# Altium footprint library PHOENIX THD.PcbLib: 109 footprints (part 5 of 8) (continued)
## PHOENIX_1777086 [mm] "PCB Header, 12A, 320V, Pitch: 5.08mm, 3 Positions, MSTBV Serie"
height 12
pads (5):
  round 2.1 hole 1.4: 1(-5.08,0) 2(0,0) 3(5.08,0)
  round 3.8 hole 2.4: P1(-10.16,0) P2(10.16,0)
Top Overlay:
  lines w0.2: -12.7,4.23 -6.055,4.23 ; -7.62,-2.2 -7.12,-2.2 ; -7.62,3.093 7.62,3.093 ; -5.724,3.093 -6.055,3.405 ; -4.436,3.093 -4.105,3.405 ; -0.644,3.093 -0.975,3.405 ; 0.644,3.093 0.975,3.405 ; 4.436,3.093 4.105,3.405 ; 5.724,3.093 6.055,3.405 ; 7.62,-2.2 7.12,-2.2 ; 12.7,4.23 6.055,4.23 ; -7.234,-2.5 ccw(c-5.08,0) -2.926,-2.5 ; -7.234,-2.5 -7.62,-2.5 -7.62,3.405 -6.055,3.405 ; -7.234,-2.5 -7.12,-2.2 ; -7.12,-2.2 ccw(c-5.08,0) -3.04,-2.2 ; -6.055,3.405 -6.055,4.23 ; -6.055,4.23 -5.685,4.703 -4.475,4.703 -4.105,4.23 ; -4.105,3.405 -0.975,3.405 ; -4.105,3.405 -4.105,4.23 ; -4.105,4.23 -0.975,4.23 ; -3.04,-2.2 -2.926,-2.5 ; -3.04,-2.2 -2.04,-2.2 ; -2.926,-2.5 -2.154,-2.5 ; -2.154,-2.5 ccw(c0,0) 2.154,-2.5 ; -2.154,-2.5 -2.04,-2.2 ; -2.04,-2.2 ccw(c0,0) 2.04,-2.2 ; -0.975,3.405 -0.975,4.23 ; -0.975,4.23 -0.605,4.703 0.605,4.703 0.975,4.23 ; 0.975,3.405 4.105,3.405 ; 0.975,3.405 0.975,4.23 ; 0.975,4.23 4.105,4.23 ; 2.04,-2.2 2.154,-2.5 ; 2.04,-2.2 3.04,-2.2 ; 2.154,-2.5 2.926,-2.5 ; 2.926,-2.5 ccw(c5.08,0) 7.234,-2.5 ; 2.926,-2.5 3.04,-2.2 ; 3.04,-2.2 ccw(c5.08,0) 7.12,-2.2 ; 4.105,3.405 4.105,4.23 ; 4.105,4.23 4.475,4.703 5.685,4.703 6.055,4.23 ; 6.055,3.405 7.62,3.405 7.62,-2.5 7.234,-2.5 ; 6.055,3.405 6.055,4.23 ; 7.12,-2.2 7.234,-2.5 ; -12.7,-3.87 -12.7,4.73 12.7,4.73 12.7,-3.87 -12.7,-3.87 ; -2.741,-0.75 -2.54,0 -2.339,-0.75 -2.741,-0.75 ; 2.339,-0.75 2.54,0 2.741,-0.75 2.339,-0.75
  text "1" at -5.22,3.505 h0.75
  text "2" at -0.22,3.505 h0.75
  text "3" at 4.851,3.505 h0.75
Mechanical 8:
  lines w0.1: -10.66,0 -10.16,0 ; -10.16,-0.5 -10.16,0 ; -10.16,0.5 -10.16,0 ; -9.66,0 -10.16,0 ; -5.58,0 -5.08,0 ; -5.08,-0.5 -5.08,0 ; -5.08,0.5 -5.08,0 ; -4.58,0 -5.08,0 ; -0.5,0 0,0 ; 0,-0.5 0,0 ; 0,0.5 0,0 ; 0.5,0 0,0 ; 4.58,0 5.08,0 ; 5.08,-0.5 5.08,0 ; 5.08,0.5 5.08,0 ; 5.58,0 5.08,0 ; 9.66,0 10.16,0 ; 10.16,-0.5 10.16,0 ; 10.16,0.5 10.16,0 ; 10.66,0 10.16,0
Mechanical 14:
  circle w0.1: c10.16,0 r1.25
  circle w0.1: c-10.16,0 r1.25
  circle w0.1: c0,0 r1.4
  circle w0.1: c5.08,0 r1.4
  lines w0.1: -12.7,4.23 -6.055,4.23 ; -7.62,-2.2 -7.12,-2.2 ; -7.62,3.093 7.62,3.093 ; -5.724,3.093 -6.055,3.405 ; -4.436,3.093 -4.105,3.405 ; -0.644,3.093 -0.975,3.405 ; 0.644,3.093 0.975,3.405 ; 4.436,3.093 4.105,3.405 ; 5.724,3.093 6.055,3.405 ; 7.62,-2.2 7.12,-2.2 ; 12.7,4.23 6.055,4.23 ; -7.234,-2.5 ccw(c-5.08,0) -2.926,-2.5 ; -7.234,-2.5 -7.62,-2.5 -7.62,3.405 -6.055,3.405 ; -7.234,-2.5 -7.12,-2.2 ; -7.12,-2.2 ccw(c-5.08,0) -3.04,-2.2 ; -6.055,3.405 -6.055,4.23 ; -6.055,4.23 -5.685,4.703 -4.475,4.703 -4.105,4.23 ; -5.58,-0.5 -5.312,-0.232 ; -5.58,-0.5 -5.58,0.5 ; -5.58,-0.5 -4.58,-0.5 ; -5.58,0.5 -5.312,0.232 ; -5.58,0.5 -4.58,0.5 ; -5.312,-0.232 -5.312,0.232 ; -5.312,-0.232 -4.848,-0.232 ; -5.312,0.232 -4.848,0.232 ; -4.848,-0.232 -4.58,-0.5 ; -4.848,-0.232 -4.848,0.232 ; -4.848,0.232 -4.58,0.5 ; -4.58,-0.5 -4.58,0.5 ; -4.105,3.405 -0.975,3.405 ; -4.105,3.405 -4.105,4.23 ; -4.105,4.23 -0.975,4.23 ; -3.04,-2.2 -2.926,-2.5 ; -3.04,-2.2 -2.04,-2.2 ; -2.926,-2.5 -2.154,-2.5 ; -2.154,-2.5 ccw(c0,0) 2.154,-2.5 ; -2.154,-2.5 -2.04,-2.2 ; -2.04,-2.2 ccw(c0,0) 2.04,-2.2 ; -0.975,3.405 -0.975,4.23 ; -0.975,4.23 -0.605,4.703 0.605,4.703 0.975,4.23 ; -0.5,-0.5 -0.232,-0.232 ; -0.5,-0.5 0.5,-0.5 ; -0.5,-0.5 -0.5,0.5 ; -0.5,0.5 -0.232,0.232 ; -0.5,0.5 0.5,0.5 ; -0.232,-0.232 -0.232,0.232 ; -0.232,-0.232 0.232,-0.232 ; -0.232,0.232 0.232,0.232 ; 0.232,-0.232 0.5,-0.5 ; 0.232,-0.232 0.232,0.232 ; 0.232,0.232 0.5,0.5 ; 0.5,-0.5 0.5,0.5 ; 0.975,3.405 4.105,3.405 ; 0.975,3.405 0.975,4.23 ; 0.975,4.23 4.105,4.23 ; 2.04,-2.2 2.154,-2.5 ; 2.04,-2.2 3.04,-2.2 ; 2.154,-2.5 2.926,-2.5 ; 2.926,-2.5 ccw(c5.08,0) 7.234,-2.5 ; 2.926,-2.5 3.04,-2.2 ; 3.04,-2.2 ccw(c5.08,0) 7.12,-2.2 ; 4.105,3.405 4.105,4.23 ; 4.105,4.23 4.475,4.703 5.685,4.703 6.055,4.23 ; 4.58,-0.5 4.848,-0.232 ; 4.58,-0.5 5.58,-0.5 ; 4.58,-0.5 4.58,0.5 ; 4.58,0.5 4.848,0.232 ; 4.58,0.5 5.58,0.5 ; 4.848,-0.232 4.848,0.232 ; 4.848,-0.232 5.312,-0.232 ; 4.848,0.232 5.312,0.232 ; 5.312,-0.232 5.58,-0.5 ; 5.312,-0.232 5.312,0.232 ; 5.312,0.232 5.58,0.5 ; 5.58,-0.5 5.58,0.5 ; 6.055,3.405 7.62,3.405 7.62,-2.5 7.234,-2.5 ; 6.055,3.405 6.055,4.23 ; 7.12,-2.2 7.234,-2.5 ; -12.7,-3.87 -12.7,4.73 12.7,4.73 12.7,-3.87 -12.7,-3.87 ; -5.78,-1.212 ccw(c-5.08,0) -5.78,1.212 -5.78,-1.212 ; -2.741,-0.75 -2.54,0 -2.339,-0.75 -2.741,-0.75 ; 2.339,-0.75 2.54,0 2.741,-0.75 2.339,-0.75
  text "3" at 4.851,3.505 h0.75
  text "2" at -0.22,3.505 h0.75
  text "1" at -5.22,3.505 h0.75
3D body "PHOENIX_1777086.stp": height 12, standoff -3.9, extent -12.7,-3.8 12.7,4.8

## PHOENIX_1777099 [mm] "PCB Header, 12A, 320V, Pitch: 5.08mm, 4 Positions, MSTBV Serie"
height 12
pads (6):
  round 2.1 hole 1.4: 1(-7.62,0) 2(-2.54,0) 3(2.54,0) 4(7.62,0)
  round 3.8 hole 2.4: P1(-12.7,0) P2(12.7,0)
Top Overlay:
  lines w0.2: -15.24,4.23 -8.595,4.23 ; -10.16,-2.2 -9.66,-2.2 ; -10.16,3.093 10.16,3.093 ; -8.264,3.093 -8.595,3.405 ; -6.976,3.093 -6.645,3.405 ; -3.184,3.093 -3.515,3.405 ; -1.896,3.093 -1.565,3.405 ; 1.896,3.093 1.565,3.405 ; 3.184,3.093 3.515,3.405 ; 6.976,3.093 6.645,3.405 ; 8.264,3.093 8.595,3.405 ; 10.16,-2.2 9.66,-2.2 ; 15.24,4.23 8.595,4.23 ; -9.774,-2.5 ccw(c-7.62,0) -5.466,-2.5 ; -9.774,-2.5 -10.16,-2.5 -10.16,3.405 -8.595,3.405 ; -9.774,-2.5 -9.66,-2.2 ; -9.66,-2.2 ccw(c-7.62,0) -5.58,-2.2 ; -8.595,3.405 -8.595,4.23 ; -8.595,4.23 -8.225,4.703 -7.015,4.703 -6.645,4.23 ; -6.645,3.405 -3.515,3.405 ; -6.645,3.405 -6.645,4.23 ; -6.645,4.23 -3.515,4.23 ; -5.58,-2.2 -5.466,-2.5 ; -5.58,-2.2 -4.58,-2.2 ; -5.466,-2.5 -4.694,-2.5 ; -4.694,-2.5 ccw(c-2.54,0) -0.386,-2.5 ; -4.694,-2.5 -4.58,-2.2 ; -4.58,-2.2 ccw(c-2.54,0) -0.5,-2.2 ; -3.515,3.405 -3.515,4.23 ; -3.515,4.23 -3.145,4.703 -1.935,4.703 -1.565,4.23 ; -1.565,3.405 1.565,3.405 ; -1.565,3.405 -1.565,4.23 ; -1.565,4.23 1.565,4.23 ; -0.5,-2.2 -0.386,-2.5 ; -0.5,-2.2 0.5,-2.2 ; -0.386,-2.5 0.386,-2.5 ; 0.386,-2.5 ccw(c2.54,0) 4.694,-2.5 ; 0.386,-2.5 0.5,-2.2 ; 0.5,-2.2 ccw(c2.54,0) 4.58,-2.2 ; 1.565,3.405 1.565,4.23 ; 1.565,4.23 1.935,4.703 3.145,4.703 3.515,4.23 ; 3.515,3.405 6.645,3.405 ; 3.515,3.405 3.515,4.23 ; 3.515,4.23 6.645,4.23 ; 4.58,-2.2 4.694,-2.5 ; 4.58,-2.2 5.58,-2.2 ; 4.694,-2.5 5.466,-2.5 ; 5.466,-2.5 ccw(c7.62,0) 9.774,-2.5 ; 5.466,-2.5 5.58,-2.2 ; 5.58,-2.2 ccw(c7.62,0) 9.66,-2.2 ; 6.645,3.405 6.645,4.23 ; 6.645,4.23 7.015,4.703 8.225,4.703 8.595,4.23 ; 8.595,3.405 10.16,3.405 10.16,-2.5 9.774,-2.5 ; 8.595,3.405 8.595,4.23 ; 9.66,-2.2 9.774,-2.5 ; -15.24,-3.87 -15.24,4.73 15.24,4.73 15.24,-3.87 -15.24,-3.87 ; -5.281,-0.75 -5.08,0 -4.879,-0.75 -5.281,-0.75 ; -0.201,-0.75 0,0 0.201,-0.75 -0.201,-0.75 ; 4.879,-0.75 5.08,0 5.281,-0.75 4.879,-0.75
  text "4" at 7.366,3.505 h0.75
  text "3" at 2.311,3.505 h0.75
  text "2" at -2.76,3.505 h0.75
  text "1" at -7.76,3.505 h0.75
Mechanical 8:
  lines w0.1: -13.2,0 -12.7,0 ; -12.7,-0.5 -12.7,0 ; -12.7,0.5 -12.7,0 ; -12.2,0 -12.7,0 ; -8.12,0 -7.62,0 ; -7.62,-0.5 -7.62,0 ; -7.62,0.5 -7.62,0 ; -7.12,0 -7.62,0 ; -3.04,0 -2.54,0 ; -2.54,-0.5 -2.54,0 ; -2.54,0.5 -2.54,0 ; -2.04,0 -2.54,0 ; -0.5,0 0,0 ; 0,-0.5 0,0 ; 0,0.5 0,0 ; 0.5,0 0,0 ; 2.04,0 2.54,0 ; 2.54,-0.5 2.54,0 ; 2.54,0.5 2.54,0 ; 3.04,0 2.54,0 ; 7.12,0 7.62,0 ; 7.62,-0.5 7.62,0 ; 7.62,0.5 7.62,0 ; 8.12,0 7.62,0 ; 12.2,0 12.7,0 ; 12.7,-0.5 12.7,0 ; 12.7,0.5 12.7,0 ; 13.2,0 12.7,0
Mechanical 14:
  circle w0.1: c2.54,0 r1.4
  circle w0.1: c12.7,0 r1.25
  circle w0.1: c-12.7,0 r1.25
  circle w0.1: c-2.54,0 r1.4
  circle w0.1: c7.62,0 r1.4
  lines w0.1: -15.24,4.23 -8.595,4.23 ; -10.16,-2.2 -9.66,-2.2 ; -10.16,3.093 10.16,3.093 ; -8.264,3.093 -8.595,3.405 ; -6.976,3.093 -6.645,3.405 ; -3.184,3.093 -3.515,3.405 ; -1.896,3.093 -1.565,3.405 ; 1.896,3.093 1.565,3.405 ; 3.184,3.093 3.515,3.405 ; 6.976,3.093 6.645,3.405 ; 8.264,3.093 8.595,3.405 ; 10.16,-2.2 9.66,-2.2 ; 15.24,4.23 8.595,4.23 ; -9.774,-2.5 ccw(c-7.62,0) -5.466,-2.5 ; -9.774,-2.5 -10.16,-2.5 -10.16,3.405 -8.595,3.405 ; -9.774,-2.5 -9.66,-2.2 ; -9.66,-2.2 ccw(c-7.62,0) -5.58,-2.2 ; -8.595,3.405 -8.595,4.23 ; -8.595,4.23 -8.225,4.703 -7.015,4.703 -6.645,4.23 ; -8.12,-0.5 -7.852,-0.232 ; -8.12,-0.5 -8.12,0.5 ; -8.12,-0.5 -7.12,-0.5 ; -8.12,0.5 -7.852,0.232 ; -8.12,0.5 -7.12,0.5 ; -7.852,-0.232 -7.852,0.232 ; -7.852,-0.232 -7.388,-0.232 ; -7.852,0.232 -7.388,0.232 ; -7.388,-0.232 -7.12,-0.5 ; -7.388,-0.232 -7.388,0.232 ; -7.388,0.232 -7.12,0.5 ; -7.12,-0.5 -7.12,0.5 ; -6.645,3.405 -3.515,3.405 ; -6.645,3.405 -6.645,4.23 ; -6.645,4.23 -3.515,4.23 ; -5.58,-2.2 -5.466,-2.5 ; -5.58,-2.2 -4.58,-2.2 ; -5.466,-2.5 -4.694,-2.5 ; -4.694,-2.5 ccw(c-2.54,0) -0.386,-2.5 ; -4.694,-2.5 -4.58,-2.2 ; -4.58,-2.2 ccw(c-2.54,0) -0.5,-2.2 ; -3.515,3.405 -3.515,4.23 ; -3.515,4.23 -3.145,4.703 -1.935,4.703 -1.565,4.23 ; -3.04,-0.5 -2.772,-0.232 ; -3.04,-0.5 -2.04,-0.5 ; -3.04,-0.5 -3.04,0.5 ; -3.04,0.5 -2.772,0.232 ; -3.04,0.5 -2.04,0.5 ; -2.772,-0.232 -2.772,0.232 ; -2.772,-0.232 -2.308,-0.232 ; -2.772,0.232 -2.308,0.232 ; -2.308,-0.232 -2.04,-0.5 ; -2.308,-0.232 -2.308,0.232 ; -2.308,0.232 -2.04,0.5 ; -2.04,-0.5 -2.04,0.5 ; -1.565,3.405 1.565,3.405 ; -1.565,3.405 -1.565,4.23 ; -1.565,4.23 1.565,4.23 ; -0.5,-2.2 -0.386,-2.5 ; -0.5,-2.2 0.5,-2.2 ; -0.386,-2.5 0.386,-2.5 ; 0.386,-2.5 ccw(c2.54,0) 4.694,-2.5 ; 0.386,-2.5 0.5,-2.2 ; 0.5,-2.2 ccw(c2.54,0) 4.58,-2.2 ; 1.565,3.405 1.565,4.23 ; 1.565,4.23 1.935,4.703 3.145,4.703 3.515,4.23 ; 2.04,-0.5 2.308,-0.232 ; 2.04,-0.5 3.04,-0.5 ; 2.04,-0.5 2.04,0.5 ; 2.04,0.5 2.308,0.232 ; 2.04,0.5 3.04,0.5 ; 2.308,-0.232 2.308,0.232 ; 2.308,-0.232 2.772,-0.232 ; 2.308,0.232 2.772,0.232 ; 2.772,-0.232 3.04,-0.5 ; 2.772,-0.232 2.772,0.232 ; 2.772,0.232 3.04,0.5 ; 3.04,-0.5 3.04,0.5 ; 3.515,3.405 6.645,3.405 ; 3.515,3.405 3.515,4.23 ; 3.515,4.23 6.645,4.23 ; 4.58,-2.2 4.694,-2.5 ; 4.58,-2.2 5.58,-2.2 ; 4.694,-2.5 5.466,-2.5 ; 5.466,-2.5 ccw(c7.62,0) 9.774,-2.5 ; 5.466,-2.5 5.58,-2.2 ; 5.58,-2.2 ccw(c7.62,0) 9.66,-2.2 ; 6.645,3.405 6.645,4.23 ; 6.645,4.23 7.015,4.703 8.225,4.703 8.595,4.23 ; 7.12,-0.5 7.388,-0.232 ; 7.12,-0.5 8.12,-0.5 ; 7.12,-0.5 7.12,0.5 ; 7.12,0.5 7.388,0.232 ; 7.12,0.5 8.12,0.5 ; 7.388,-0.232 7.388,0.232 ; 7.388,-0.232 7.852,-0.232 ; 7.388,0.232 7.852,0.232 ; 7.852,-0.232 8.12,-0.5 ; 7.852,-0.232 7.852,0.232 ; 7.852,0.232 8.12,0.5 ; 8.12,-0.5 8.12,0.5 ; 8.595,3.405 10.16,3.405 10.16,-2.5 9.774,-2.5 ; 8.595,3.405 8.595,4.23 ; 9.66,-2.2 9.774,-2.5 ; -15.24,-3.87 -15.24,4.73 15.24,4.73 15.24,-3.87 -15.24,-3.87 ; -8.32,-1.212 ccw(c-7.62,0) -8.32,1.212 -8.32,-1.212 ; -5.281,-0.75 -5.08,0 -4.879,-0.75 -5.281,-0.75 ; -0.201,-0.75 0,0 0.201,-0.75 -0.201,-0.75 ; 4.879,-0.75 5.08,0 5.281,-0.75 4.879,-0.75
  text "1" at -7.76,3.505 h0.75
  text "2" at -2.76,3.505 h0.75
  text "3" at 2.311,3.505 h0.75
  text "4" at 7.366,3.505 h0.75
3D body "PHOENIX_1777099.stp": height 12, standoff -3.9, extent -15.24,-3.8 15.24,4.8

## PHOENIX_1777109 [mm] "PCB Header, 12A, 320V, Pitch: 5.08mm, 5 Positions, MSTBV Serie"
height 12
pads (7):
  round 2.1 hole 1.4: 1(-10.16,0) 2(-5.08,0) 3(0,0) 4(5.08,0) 5(10.16,0)
  round 3.8 hole 2.4: P1(-15.24,0) P2(15.24,0)
Top Overlay:
  lines w0.2: -12.7,-2.2 -12.2,-2.2 ; -12.7,3.093 12.7,3.093 ; -10.804,3.093 -11.135,3.405 ; -9.516,3.093 -9.185,3.405 ; -8.12,-2.201 -7.12,-2.2 ; -5.724,3.093 -6.055,3.405 ; -4.436,3.093 -4.105,3.405 ; -0.644,3.093 -0.975,3.405 ; 0.644,3.093 0.975,3.405 ; 4.436,3.093 4.105,3.405 ; 5.724,3.093 6.055,3.405 ; 9.516,3.093 9.185,3.405 ; 10.804,3.093 11.135,3.405 ; 12.7,-2.2 12.2,-2.2 ; 17.78,4.23 11.135,4.23 ; -12.314,-2.5 ccw(c-10.16,0) -8.006,-2.5 ; -12.314,-2.5 -12.2,-2.2 ; -12.314,-2.5 -12.7,-2.5 -12.7,3.405 -11.135,3.405 ; -12.2,-2.2 ccw(c-10.16,0) -8.12,-2.2 -8.006,-2.5 ; -11.135,3.405 -11.135,4.23 -10.765,4.703 -9.555,4.703 -9.185,4.23 ; -9.185,3.405 -9.185,4.23 ; -9.185,3.405 -6.055,3.405 ; -9.185,4.23 -6.055,4.23 ; -8.006,-2.5 -7.234,-2.5 ; -7.234,-2.5 ccw(c-5.08,0) -2.926,-2.5 ; -7.234,-2.5 -7.12,-2.2 ; -7.12,-2.2 ccw(c-5.08,0) -3.04,-2.2 ; -6.055,3.405 -6.055,4.23 ; -6.055,4.23 -5.685,4.703 -4.475,4.703 -4.105,4.23 ; -4.105,3.405 -4.105,4.23 ; -4.105,3.405 -0.975,3.405 ; -4.105,4.23 -0.975,4.23 ; -3.04,-2.2 -2.04,-2.2 ; -3.04,-2.2 -2.926,-2.5 ; -2.926,-2.5 -2.154,-2.5 ; -2.154,-2.5 ccw(c0,0) 2.154,-2.5 ; -2.154,-2.5 -2.04,-2.2 ; -2.04,-2.2 ccw(c0,0) 2.04,-2.2 ; -0.975,3.405 -0.975,4.23 ; -0.975,4.23 -0.605,4.703 0.605,4.703 0.975,4.23 ; 0.975,3.405 0.975,4.23 ; 0.975,3.405 4.105,3.405 ; 0.975,4.23 4.105,4.23 ; 2.04,-2.2 3.04,-2.2 ; 2.04,-2.2 2.154,-2.5 ; 2.154,-2.5 2.926,-2.5 ; 2.926,-2.5 ccw(c5.08,0) 7.234,-2.5 ; 2.926,-2.5 3.04,-2.2 ; 3.04,-2.2 ccw(c5.08,0) 7.12,-2.2 ; 4.105,3.405 4.105,4.23 ; 4.105,4.23 4.475,4.703 5.685,4.703 6.055,4.23 ; 6.055,3.405 6.055,4.23 ; 6.055,3.405 9.185,3.405 ; 6.055,4.23 9.185,4.23 ; 7.12,-2.2 8.12,-2.2 ; 7.12,-2.2 7.234,-2.5 ; 7.234,-2.5 8.006,-2.5 ; 8.006,-2.5 ccw(c10.16,0) 12.314,-2.5 ; 8.006,-2.5 8.12,-2.2 ; 8.12,-2.2 ccw(c10.16,0) 12.2,-2.2 ; 9.185,3.405 9.185,4.23 ; 9.185,4.23 9.555,4.703 10.765,4.703 11.135,4.23 ; 11.135,3.405 11.135,4.23 ; 11.135,3.405 12.7,3.405 12.7,-2.5 12.314,-2.5 ; 12.2,-2.2 12.314,-2.5 ; -17.78,-3.87 -17.78,4.73 17.78,4.73 17.78,-3.87 -17.78,-3.87 ; -7.821,-0.75 -7.419,-0.75 -7.62,0 -7.821,-0.75 ; -2.741,-0.75 -2.339,-0.75 -2.54,0 -2.741,-0.75 ; 2.339,-0.75 2.741,-0.75 2.54,0 2.339,-0.75 ; 7.419,-0.75 7.821,-0.75 7.62,0 7.419,-0.75
  text "5" at 9.906,3.505 h0.75
  text "4" at 4.826,3.505 h0.75
  text "3" at -0.229,3.505 h0.75
  text "2" at -5.3,3.505 h0.75
  text "1" at -10.3,3.505 h0.75
Mechanical 8:
  lines w0.1: -15.74,0 -15.24,0 ; -15.24,-0.5 -15.24,0 ; -15.24,0.5 -15.24,0 ; -14.74,0 -15.24,0 ; -10.66,0 -10.16,0 ; -10.16,-0.5 -10.16,0 ; -10.16,0.5 -10.16,0 ; -9.66,0 -10.16,0 ; -5.58,0 -5.08,0 ; -5.08,-0.5 -5.08,0 ; -5.08,0.5 -5.08,0 ; -4.58,0 -5.08,0 ; -0.5,0 0,0 ; 0,-0.5 0,0 ; 0,0.5 0,0 ; 0.5,0 0,0 ; 4.58,0 5.08,0 ; 5.08,-0.5 5.08,0 ; 5.08,0.5 5.08,0 ; 5.58,0 5.08,0 ; 9.66,0 10.16,0 ; 10.16,-0.5 10.16,0 ; 10.16,0.5 10.16,0 ; 10.66,0 10.16,0 ; 14.74,0 15.24,0 ; 15.24,-0.5 15.24,0 ; 15.24,0.5 15.24,0 ; 15.74,0 15.24,0
Mechanical 14:
  drawing of 165 lines, arcs and shapes, not listed
  text "5" at 9.906,3.505 h0.75
  text "1" at -10.3,3.505 h0.75
  text "2" at -5.3,3.505 h0.75
  text "3" at -0.229,3.505 h0.75
  text "4" at 4.826,3.505 h0.75
3D body "PHOENIX_1777109.stp": height 12, standoff -3.9, extent -17.78,-3.87 17.78,4.73

## PHOENIX_1777112 [mm] "PCB Header, 12A, 320V, Pitch: 5.08mm, 6 Positions, MSTBV Serie"
height 12
pads (8):
  round 2.1 hole 1.4: 1(-12.7,0) 2(-7.62,0) 3(-2.54,0) 4(2.54,0) 5(7.62,0) 6(12.7,0)
  round 3.8 hole 2.4: P1(-17.78,0) P2(17.78,0)
Top Overlay:
  lines w0.1: -20.32,4.3 -13.675,4.3 ; -15.24,-2.13 -14.74,-2.13 ; -15.24,3.163 15.24,3.163 ; -13.344,3.163 -13.675,3.475 ; -13.305,3.163 -13.305,4.773 ; -12.095,3.163 -12.095,4.773 ; -12.056,3.163 -11.725,3.475 ; -8.264,3.163 -8.595,3.475 ; -8.225,3.163 -8.225,4.773 ; -7.015,3.163 -7.015,4.773 ; -6.976,3.163 -6.645,3.475 ; -3.184,3.163 -3.515,3.475 ; -3.145,3.163 -3.145,4.773 ; -1.935,3.163 -1.935,4.773 ; -1.896,3.163 -1.565,3.475 ; 1.896,3.163 1.565,3.475 ; 1.935,3.163 1.935,4.773 ; 3.145,3.163 3.145,4.773 ; 3.184,3.163 3.515,3.475 ; 6.976,3.163 6.645,3.475 ; 7.015,3.163 7.015,4.773 ; 8.225,3.163 8.225,4.773 ; 8.264,3.163 8.595,3.475 ; 16.805,4.3 13.675,4.3 ; 20.32,4.3 13.675,4.3 ; -14.854,-2.43 ccw(c-12.7,0.07) -10.546,-2.43 ; -14.854,-2.43 -15.24,-2.43 -15.24,3.475 -13.675,3.475 ; -14.854,-2.43 -14.74,-2.13 ; -14.74,-2.13 ccw(c-12.7,0.07) -10.66,-2.13 ; -13.675,3.475 -13.675,4.3 ; -13.675,4.3 -13.305,4.773 ; -13.305,4.773 -12.095,4.773 ; -12.095,4.773 -11.725,4.3 ; -11.725,3.475 -8.595,3.475 ; -11.725,3.475 -11.725,4.3 ; -11.725,4.3 -8.595,4.3 ; -10.66,-2.13 -10.546,-2.43 ; -10.66,-2.13 -9.66,-2.13 ; -10.546,-2.43 -9.774,-2.43 ; -9.774,-2.43 ccw(c-7.62,0.07) -5.466,-2.43 ; -9.774,-2.43 -9.66,-2.13 ; -9.66,-2.13 ccw(c-7.62,0.07) -5.58,-2.13 ; -8.595,3.475 -8.595,4.3 ; -8.595,4.3 -8.225,4.773 ; -8.225,4.773 -7.015,4.773 ; -7.015,4.773 -6.645,4.3 ; -6.645,3.475 -3.515,3.475 ; -6.645,3.475 -6.645,4.3 ; -6.645,4.3 -3.515,4.3 ; -5.58,-2.13 -5.466,-2.43 ; -5.58,-2.13 -4.58,-2.13 ; -5.466,-2.43 -4.694,-2.43 ; -4.694,-2.43 ccw(c-2.54,0.07) -0.386,-2.43 ; -4.694,-2.43 -4.58,-2.13 ; -4.58,-2.13 ccw(c-2.54,0.07) -0.5,-2.13 ; -3.515,3.475 -3.515,4.3 ; -3.515,4.3 -3.145,4.773 ; -3.145,4.773 -1.935,4.773 ; -1.935,4.773 -1.565,4.3 ; -1.565,3.475 1.565,3.475 ; -1.565,3.475 -1.565,4.3 ; -1.565,4.3 1.565,4.3 ; -0.5,-2.13 -0.386,-2.43 ; -0.5,-2.13 0.5,-2.13 ; -0.386,-2.43 0.386,-2.43 ; 0.386,-2.43 ccw(c2.54,0.07) 4.694,-2.43 ; 0.386,-2.43 0.5,-2.13 ; 0.5,-2.13 ccw(c2.54,0.07) 4.58,-2.13 ; 1.565,3.475 1.565,4.3 ; 1.565,4.3 1.935,4.773 ; 1.935,4.773 3.145,4.773 ; 3.145,4.773 3.515,4.3 ; 3.515,3.475 6.645,3.475 ; 3.515,3.475 3.515,4.3 ; 3.515,4.3 6.645,4.3 ; 4.58,-2.13 4.694,-2.43 ; 4.58,-2.13 5.58,-2.13 ; 4.694,-2.43 5.466,-2.43 ; 5.466,-2.43 ccw(c7.62,0.07) 9.774,-2.43 ; 5.466,-2.43 5.58,-2.13 ; 5.58,-2.13 ccw(c7.62,0.07) 9.66,-2.13 ; 6.645,3.475 6.645,4.3 ; 6.645,4.3 7.015,4.773 ; 7.015,4.773 8.225,4.773 ; 8.225,4.773 8.595,4.3 ; 8.595,3.475 11.725,3.475 ; 8.595,3.475 11.725,3.475 ; 8.595,3.475 8.595,4.3 ; 8.595,4.3 11.725,4.3 ; 8.595,4.3 11.725,4.3 ; 9.66,-2.13 9.774,-2.43 ; 9.66,-2.13 10.66,-2.13 ; 9.774,-2.43 10.546,-2.43 ; 10.546,-2.43 ccw(c12.7,0.07) 14.854,-2.43 ; 10.546,-2.43 ccw(c12.7,0.07) 14.854,-2.43 ; 10.546,-2.43 10.66,-2.13 ; 10.66,-2.13 ccw(c12.7,0.07) 14.74,-2.13 ; 10.66,-2.13 ccw(c12.7,0.07) 14.74,-2.13 ; 11.725,3.475 12.056,3.163 11.725,3.475 ; 11.725,3.475 11.725,4.3 ; 11.725,3.475 11.725,4.3 ; 11.725,4.3 12.095,4.773 ; 11.725,4.3 12.095,4.773 ; 12.095,4.773 12.095,3.163 12.095,4.773 ; 12.095,4.773 13.305,4.773 ; 12.095,4.773 13.305,4.773 ; 13.305,4.773 13.305,3.163 13.305,4.773 ; 13.305,4.773 13.675,4.3 ; 13.305,4.773 13.675,4.3 ; 13.675,3.475 15.24,3.475 ; 13.675,3.475 13.344,3.163 13.675,3.475 ; 13.675,3.475 13.675,4.3 ; 13.675,3.475 15.24,3.475 ; 13.675,3.475 13.675,4.3 ; 14.74,-2.13 14.854,-2.43 ; 14.74,-2.13 15.24,-2.13 14.74,-2.13 ; 14.74,-2.13 14.854,-2.43 ; 14.854,-2.43 15.24,-2.43 ; 14.854,-2.43 15.24,-2.43 ; 15.24,-2.43 15.24,3.475 ; -20.32,-3.8 -20.32,4.8 20.32,4.8 20.32,-3.8 -20.32,-3.8 ; -10.361,-0.68 -9.959,-0.68 -10.16,0.07 -10.361,-0.68 ; -5.281,-0.68 -4.879,-0.68 -5.08,0.07 -5.281,-0.68 ; -0.201,-0.68 0,0.07 0.201,-0.68 -0.201,-0.68 ; 4.879,-0.68 5.281,-0.68 5.08,0.07 4.879,-0.68 ; 9.959,-0.68 10.361,-0.68 10.16,0.07 9.959,-0.68
  text "5" at 7.417,3.575 h0.75
  text "4" at 2.286,3.575 h0.75
  text "3" at -2.769,3.575 h0.75
  text "2" at -7.84,3.575 h0.75
  text "1" at -12.84,3.575 h0.75
  text "6" at 12.497,3.575 h0.75
Mechanical 8:
  lines w0.1: -18.28,0 -17.78,0 ; -17.78,-0.5 -17.78,0 ; -17.78,0.5 -17.78,0 ; -17.28,0 -17.78,0 ; -13.2,0 -12.7,0 ; -12.7,-0.5 -12.7,0 ; -12.7,0.5 -12.7,0 ; -12.2,0 -12.7,0 ; -8.12,0 -7.62,0 ; -7.62,-0.5 -7.62,0 ; -7.62,0.5 -7.62,0 ; -7.12,0 -7.62,0 ; -3.04,0 -2.54,0 ; -2.54,-0.5 -2.54,0 ; -2.54,0.5 -2.54,0 ; -2.04,0 -2.54,0 ; -0.5,0 0,0 ; 0,-0.5 0,0 ; 0,0.5 0,0 ; 0.5,0 0,0 ; 2.04,0 2.54,0 ; 2.54,-0.5 2.54,0 ; 2.54,0.5 2.54,0 ; 3.04,0 2.54,0 ; 7.12,0 7.62,0 ; 7.62,-0.5 7.62,0 ; 7.62,0.5 7.62,0 ; 8.12,0 7.62,0 ; 9.66,0 10.16,0 ; 10.16,-0.5 10.16,0 ; 10.16,0.5 10.16,0 ; 10.66,0 10.16,0 ; 17.28,0 17.78,0 ; 17.78,-0.5 17.78,0 ; 17.78,0.5 17.78,0 ; 18.28,0 17.78,0 ; 12.7,0 12.2,0 12.7,0 ; 12.7,0 12.7,0.5 12.7,0 ; 12.7,0 12.7,-0.5 12.7,0 ; 12.7,0 13.2,0 12.7,0
Mechanical 14:
  drawing of 227 lines, arcs and shapes, not listed
  text "6" at 12.497,3.575 h0.75
  text "1" at -12.84,3.575 h0.75
  text "2" at -7.84,3.575 h0.75
  text "3" at -2.769,3.575 h0.75
  text "4" at 2.286,3.575 h0.75
  text "5" at 7.417,3.575 h0.75
3D body "PHOENIX_1777112.stp": height 12, standoff -3.4, extent -20.32,-3.8 20.32,4.8

## PHOENIX_1777125 [mm] "PCB Header, 12A, 320V, Pitch: 5.08mm, 7 Positions, MSTBV Serie"
height 12
pads (9):
  round 2.1 hole 1.4: 1(-15.24,0) 2(-10.16,0) 3(-5.08,0) 4(0,0) 5(5.08,0) 6(10.16,0) 7(15.24,0)
  round 3.8 hole 2.4: P1(-20.32,0) P2(20.32,0)
Top Overlay:
  lines w0.2: -22.86,4.23 -16.215,4.23 ; -17.78,-2.2 -17.28,-2.2 ; -17.78,3.093 17.78,3.093 ; -15.884,3.093 -16.215,3.405 ; -14.596,3.093 -14.265,3.405 ; -10.804,3.093 -11.135,3.405 ; -9.516,3.093 -9.185,3.405 ; -5.724,3.093 -6.055,3.405 ; -4.436,3.093 -4.105,3.405 ; -0.644,3.093 -0.975,3.405 ; 0.644,3.093 0.975,3.405 ; 4.436,3.093 4.105,3.405 ; 5.724,3.093 6.055,3.405 ; 9.516,3.093 9.185,3.405 ; 10.804,3.093 11.135,3.405 ; 14.596,3.093 14.265,3.405 ; 15.884,3.093 16.215,3.405 ; 17.78,-2.2 17.28,-2.2 ; 22.86,4.23 16.215,4.23 ; -17.394,-2.5 ccw(c-15.24,0) -13.086,-2.5 ; -17.394,-2.5 -17.28,-2.2 ; -17.394,-2.5 -17.78,-2.5 -17.78,3.405 -16.215,3.405 ; -17.28,-2.2 ccw(c-15.24,0) -13.2,-2.2 ; -16.215,3.405 -16.215,4.23 ; -16.215,4.23 -15.845,4.703 -14.635,4.703 -14.265,4.23 ; -14.265,3.405 -14.265,4.23 ; -14.265,3.405 -11.135,3.405 ; -14.265,4.23 -11.135,4.23 ; -13.2,-2.2 -12.2,-2.2 ; -13.2,-2.2 -13.086,-2.5 ; -13.086,-2.5 -12.314,-2.5 ; -12.314,-2.5 ccw(c-10.16,0) -8.006,-2.5 ; -12.314,-2.5 -12.2,-2.2 ; -12.2,-2.2 ccw(c-10.16,0) -8.12,-2.2 ; -11.135,3.405 -11.135,4.23 ; -11.135,4.23 -10.765,4.703 -9.555,4.703 -9.185,4.23 ; -9.185,3.405 -9.185,4.23 ; -9.185,3.405 -6.055,3.405 ; -9.185,4.23 -6.055,4.23 ; -8.12,-2.2 -8.006,-2.5 ; -8.12,-2.2 -7.12,-2.2 ; -8.006,-2.5 -7.234,-2.5 ; -7.234,-2.5 ccw(c-5.08,0) -2.926,-2.5 ; -7.234,-2.5 -7.12,-2.2 ; -7.12,-2.2 ccw(c-5.08,0) -3.04,-2.2 ; -6.055,3.405 -6.055,4.23 ; -6.055,4.23 -5.685,4.703 -4.475,4.703 -4.105,4.23 ; -4.105,3.405 -4.105,4.23 ; -4.105,3.405 -0.975,3.405 ; -4.105,4.23 -0.975,4.23 ; -3.04,-2.2 -2.926,-2.5 ; -3.04,-2.2 -2.04,-2.2 ; -2.926,-2.5 -2.154,-2.5 ; -2.154,-2.5 ccw(c0,0) 2.154,-2.5 ; -2.154,-2.5 -2.04,-2.2 ; -2.04,-2.2 ccw(c0,0) 2.04,-2.2 ; -0.975,3.405 -0.975,4.23 ; -0.975,4.23 -0.605,4.703 0.605,4.703 0.975,4.23 ; 0.975,3.405 0.975,4.23 ; 0.975,3.405 4.105,3.405 ; 0.975,4.23 4.105,4.23 ; 2.04,-2.2 2.154,-2.5 ; 2.04,-2.2 3.04,-2.2 ; 2.154,-2.5 2.926,-2.5 ; 2.926,-2.5 ccw(c5.08,0) 7.234,-2.5 ; 2.926,-2.5 3.04,-2.2 ; 3.04,-2.2 ccw(c5.08,0) 7.12,-2.2 ; 4.105,3.405 4.105,4.23 ; 4.105,4.23 4.475,4.703 5.685,4.703 6.055,4.23 ; 6.055,3.405 9.185,3.405 ; 6.055,3.405 6.055,4.23 ; 6.055,4.23 9.185,4.23 ; 7.12,-2.2 8.12,-2.2 ; 7.12,-2.2 7.234,-2.5 ; 7.234,-2.5 8.006,-2.5 ; 8.006,-2.5 ccw(c10.16,0) 12.314,-2.5 ; 8.006,-2.5 8.12,-2.2 ; 8.12,-2.2 ccw(c10.16,0) 12.2,-2.2 ; 9.185,3.405 9.185,4.23 ; 9.185,4.23 9.555,4.703 10.765,4.703 11.135,4.23 ; 11.135,3.405 11.135,4.23 ; 11.135,3.405 14.265,3.405 ; 11.135,4.23 14.265,4.23 ; 12.2,-2.2 13.2,-2.2 ; 12.2,-2.2 12.314,-2.5 ; 12.314,-2.5 13.086,-2.5 ; 13.086,-2.5 ccw(c15.24,0) 17.394,-2.5 ; 13.086,-2.5 13.2,-2.2 ; 13.2,-2.2 ccw(c15.24,0) 17.28,-2.2 ; 14.265,3.405 14.265,4.23 ; 14.265,4.23 14.635,4.703 15.845,4.703 16.215,4.23 ; 16.215,3.405 16.215,4.23 ; 16.215,3.405 17.78,3.405 17.78,-2.5 17.394,-2.5 ; 17.28,-2.2 17.394,-2.5 ; -22.86,-3.87 22.86,-3.87 22.86,4.73 -22.86,4.73 -22.86,-3.87 ; -12.901,-0.75 -12.499,-0.75 -12.7,0 -12.901,-0.75 ; -7.821,-0.75 -7.419,-0.75 -7.62,0 -7.821,-0.75 ; -2.741,-0.75 -2.339,-0.75 -2.54,0 -2.741,-0.75 ; 2.339,-0.75 2.741,-0.75 2.54,0 2.339,-0.75 ; 7.419,-0.75 7.821,-0.75 7.62,0 7.419,-0.75 ; 12.499,-0.75 12.901,-0.75 12.7,0 12.499,-0.75
  text "7" at 15.037,3.505 h0.75
  text "6" at 9.957,3.505 h0.75
  text "1" at -15.38,3.505 h0.75
  text "2" at -10.38,3.505 h0.75
  text "3" at -5.309,3.505 h0.75
  text "4" at -0.254,3.505 h0.75
  text "5" at 4.877,3.505 h0.75
Mechanical 8:
  lines w0.1: -20.82,0 -20.32,0 ; -20.32,-0.5 -20.32,0 ; -20.32,0.5 -20.32,0 ; -19.82,0 -20.32,0 ; -15.74,0 -15.24,0 ; -15.24,-0.5 -15.24,0 ; -15.24,0.5 -15.24,0 ; -14.74,0 -15.24,0 ; -10.66,0 -10.16,0 ; -10.16,-0.5 -10.16,0 ; -10.16,0.5 -10.16,0 ; -9.66,0 -10.16,0 ; -5.58,0 -5.08,0 ; -5.08,-0.5 -5.08,0 ; -5.08,0.5 -5.08,0 ; -4.58,0 -5.08,0 ; -0.5,0 0,0 ; 0,-0.5 0,0 ; 0,0.5 0,0 ; 0.5,0 0,0 ; 4.58,0 5.08,0 ; 5.08,-0.5 5.08,0 ; 5.08,0.5 5.08,0 ; 5.58,0 5.08,0 ; 9.66,0 10.16,0 ; 10.16,-0.5 10.16,0 ; 10.16,0.5 10.16,0 ; 10.66,0 10.16,0 ; 14.74,0 15.24,0 ; 15.24,-0.5 15.24,0 ; 15.24,0.5 15.24,0 ; 15.74,0 15.24,0 ; 19.82,0 20.32,0 ; 20.32,-0.5 20.32,0 ; 20.32,0.5 20.32,0 ; 20.82,0 20.32,0
Mechanical 14:
  drawing of 228 lines, arcs and shapes, not listed
  text "5" at 4.877,3.505 h0.75
  text "4" at -0.254,3.505 h0.75
  text "3" at -5.309,3.505 h0.75
  text "2" at -10.38,3.505 h0.75
  text "1" at -15.38,3.505 h0.75
  text "6" at 9.957,3.505 h0.75
  text "7" at 15.037,3.505 h0.75
3D body "PHOENIX_1777125.stp": height 12, standoff -3.9, extent -22.86,-3.8 22.86,4.8

## PHOENIX_1777154 [mm] "PCB Header, 12A, 320V, Pitch: 5.08mm, 10 Positions, MSTBV Serie"
height 12
pads (12):
  round 2.1 hole 1.4: 1(-22.86,0) 2(-17.78,0) 3(-12.7,0) 4(-7.62,0) 5(-2.54,0) 6(2.54,0) 7(7.62,0) 8(12.7,0) 9(17.78,0) 10(22.86,0)
  round 3.8 hole 2.4: P1(-27.94,0) P2(27.94,0)
Top Overlay:
  drawing of 188 lines, arcs and shapes, not listed
  text "5" at -2.743,3.48 h0.75
  text "4" at -7.874,3.48 h0.75
  text "3" at -12.929,3.48 h0.75
  text "2" at -18,3.48 h0.75
  text "6" at 2.337,3.48 h0.75
  text "7" at 7.417,3.48 h0.75
  text "8" at 12.471,3.48 h0.75
  text "9" at 17.577,3.48 h0.75
  text "10" at 22.352,3.48 h0.75
  text "1" at -23,3.48 h0.75
Mechanical 8:
  lines w0.1: -28.44,-0.025 -27.94,-0.025 ; -27.94,-0.525 -27.94,-0.025 ; -27.94,0.475 -27.94,-0.025 ; -27.44,-0.025 -27.94,-0.025 ; -23.36,-0.025 -22.86,-0.025 ; -22.86,-0.525 -22.86,-0.025 ; -22.86,0.475 -22.86,-0.025 ; -22.36,-0.025 -22.86,-0.025 ; -18.28,-0.025 -17.78,-0.025 ; -17.78,-0.525 -17.78,-0.025 ; -17.78,0.475 -17.78,-0.025 ; -17.28,-0.025 -17.78,-0.025 ; -13.2,-0.025 -12.7,-0.025 ; -12.7,-0.525 -12.7,-0.025 ; -12.7,0.475 -12.7,-0.025 ; -12.2,-0.025 -12.7,-0.025 ; -8.12,-0.025 -7.62,-0.025 ; -7.62,-0.525 -7.62,-0.025 ; -7.62,0.475 -7.62,-0.025 ; -7.12,-0.025 -7.62,-0.025 ; -3.04,-0.025 -2.54,-0.025 ; -2.54,-0.525 -2.54,-0.025 ; -2.54,0.475 -2.54,-0.025 ; -2.04,-0.025 -2.54,-0.025 ; -0.5,-0.025 0,-0.025 ; 0,-0.525 0,-0.025 ; 0,0.475 0,-0.025 ; 0.5,-0.025 0,-0.025 ; 2.04,-0.025 2.54,-0.025 ; 2.54,-0.525 2.54,-0.025 ; 2.54,0.475 2.54,-0.025 ; 3.04,-0.025 2.54,-0.025 ; 7.12,-0.025 7.62,-0.025 ; 7.62,-0.525 7.62,-0.025 ; 7.62,0.475 7.62,-0.025 ; 8.12,-0.025 7.62,-0.025 ; 12.2,-0.025 12.7,-0.025 ; 12.7,-0.525 12.7,-0.025 ; 12.7,0.475 12.7,-0.025 ; 13.2,-0.025 12.7,-0.025 ; 17.28,-0.025 17.78,-0.025 ; 17.78,-0.525 17.78,-0.025 ; 17.78,0.475 17.78,-0.025 ; 18.28,-0.025 17.78,-0.025 ; 22.36,-0.025 22.86,-0.025 ; 22.86,-0.525 22.86,-0.025 ; 22.86,0.475 22.86,-0.025 ; 23.36,-0.025 22.86,-0.025 ; 27.44,-0.025 27.94,-0.025 ; 27.94,-0.525 27.94,-0.025 ; 27.94,0.475 27.94,-0.025 ; 28.44,-0.025 27.94,-0.025
Mechanical 14:
  drawing of 341 lines, arcs and shapes, not listed
  text "10" at 22.352,3.48 h0.75
  text "9" at 17.577,3.48 h0.75
  text "8" at 12.471,3.48 h0.75
  text "7" at 7.417,3.48 h0.75
  text "6" at 2.337,3.48 h0.75
  text "1" at -23,3.48 h0.75
  text "2" at -18,3.48 h0.75
  text "3" at -12.929,3.48 h0.75
  text "4" at -7.874,3.48 h0.75
  text "5" at -2.743,3.48 h0.75
3D body "PHOENIX_1777154.stp": height 12, standoff -3.4, extent -30.48,-3.825 30.48,4.775